# Altium footprint library TarabusLib_KOR.PcbLib: 560 footprints (part 28 of 35)
Each footprint in its own frame and in the unit in brackets; x right, y up, seen from the top. Pads: shape width x height; smd on the part's side, far side on the other; paste and mask are expansions set on the pad; w line width, h text height; cw(c..) or ccw(c..) is an arc to the next point about the centre after c.
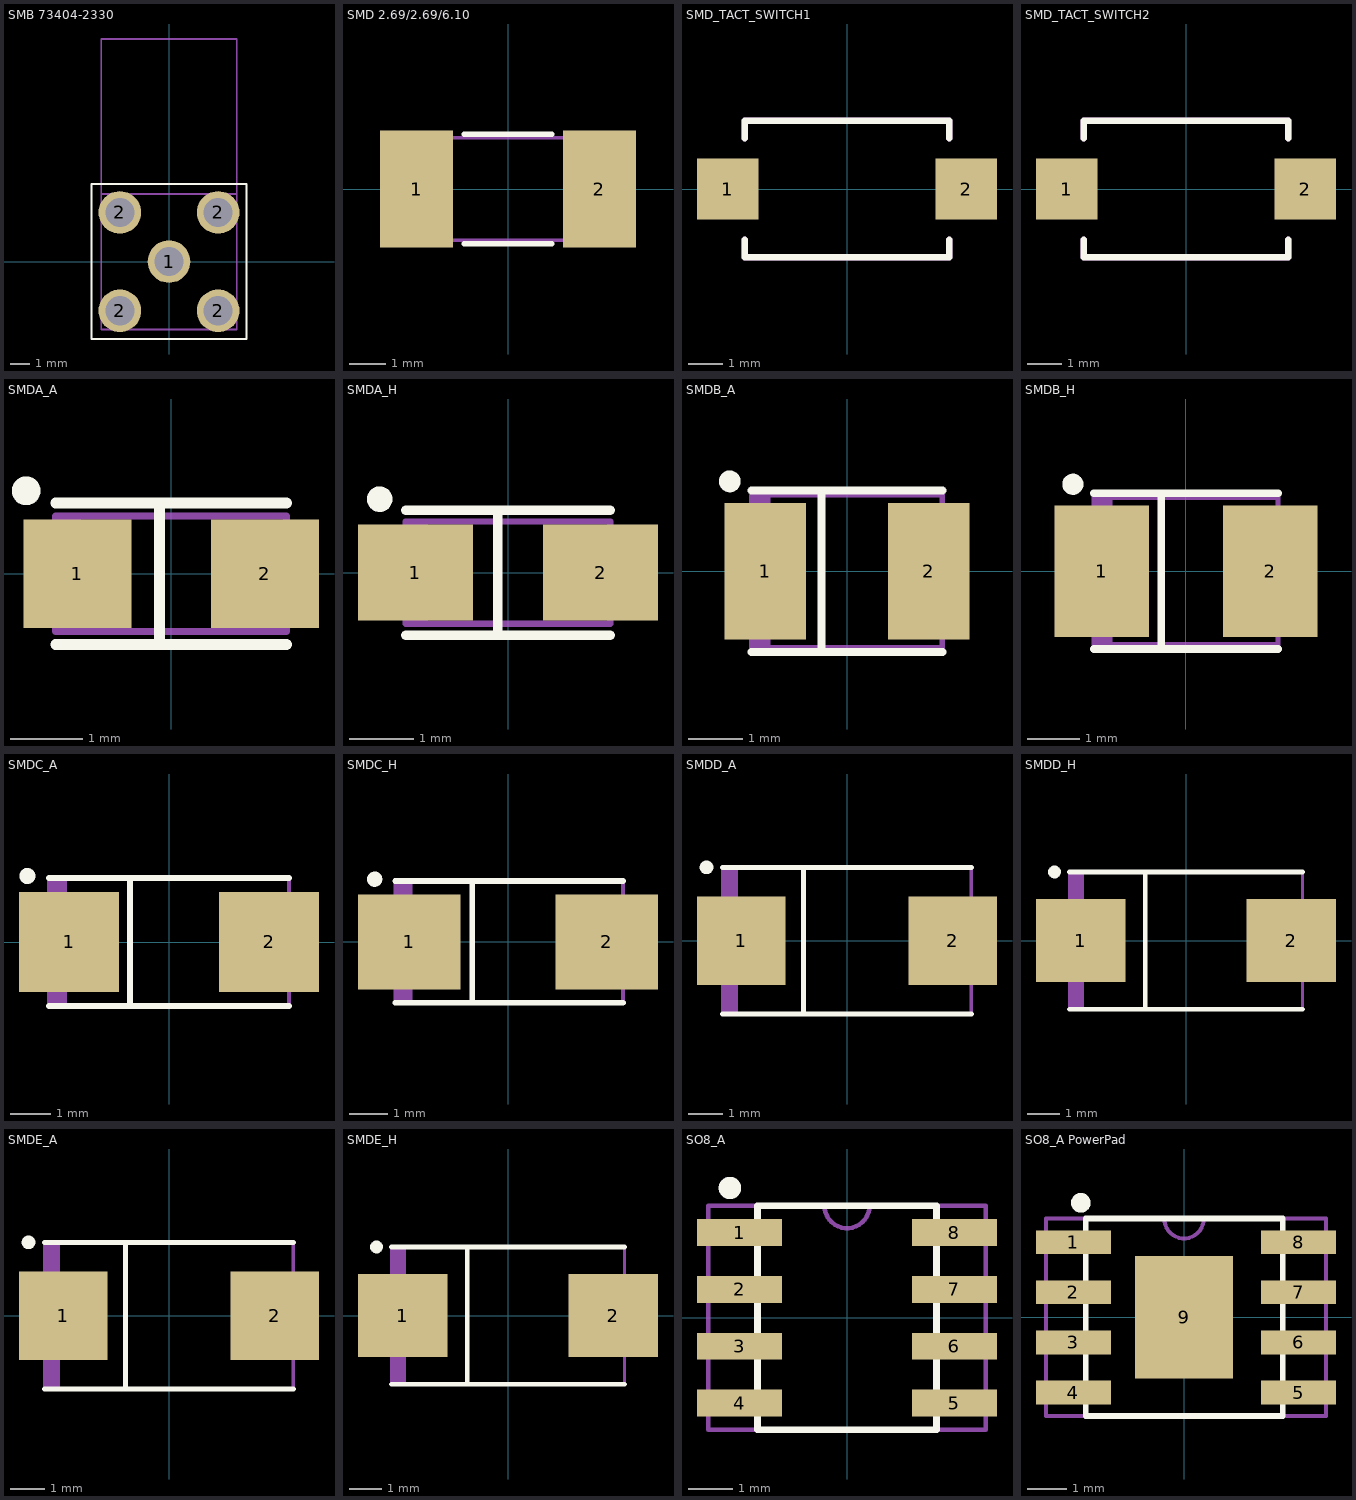
[diagram p27: the footprints below, top view; thin cyan lines are the x and y axes]

## SMB 73404-2330 [mm]
pads (5):
  round 2.2 hole 1.5: 1(0,0) 2(-2.54,-2.54) 2(-2.54,2.54) 2(2.54,-2.54) 2(2.54,2.54)
Top Overlay:
  lines w0.1: -4,-4 4,-4 4,4 -4,4 -4,-4
Mechanical 9:
  text ".Comment" at -0.875,4.45 h0.6
  text ".Designator" at -1.35,5.1 h0.8
Mechanical 11:
  lines w0.1: -3.5,3.5 -3.5,11.5 3.5,11.5 3.5,3.5 ; -3.5,3.5 3.5,3.5 ; -3.5,3.5 -3.5,-3.5 3.5,-3.5 3.5,3.5
3D body "SMB Coaxial.STEP": height 8.15, standoff -4.41, extent -3.125,-3.15 3.175,11

## SMD 2.69/2.69/6.10 [mm]
pads (2):
  rect 2x3.2 smd: 1(-2.5,0) 2(2.5,0)
Top Overlay:
  lines w0.15: -1.2,-1.5 1.2,-1.5 ; -1.2,1.5 1.2,1.5
Mechanical 7:
  lines w0.1: -3.1,-1.4 3.1,-1.4 3.1,1.4 -3.1,1.4 -3.1,-1.4
3D body: height 2.69, standoff 0, extent -3.1,-1.4 3.1,1.4

## SMD_TACT_SWITCH1 [mm]
height 2.5
pads (2):
  rect 1.8x1.8 smd: 1(-3.5,0) 2(3.5,0)
Top Overlay:
  lines w0.2: -3,-1.5 -3,-2 3,-2 3,-1.5 ; -3,1.5 -3,2 3,2 3,1.5
Mechanical 7:
  lines w0.2: -3,-1.5 -3,-2 3,-2 3,-1.5 ; -3,1.5 -3,2 3,2 3,1.5
Mechanical 10:
  text ".Comment" at 0.5,-3 h0.6
  text ".Designator" at -0.5,2.5 h0.8
3D body "Кнопка_IT-1181.STEP": height 2.5, standoff 0, extent -4,-1.8 4,1.8

## SMD_TACT_SWITCH2 [mm]
height 2.5
pads (2):
  rect 1.8x1.8 smd: 1(-3.5,0) 2(3.5,0)
Top Overlay:
  lines w0.2: -3,-1.5 -3,-2 3,-2 3,-1.5 ; -3,1.5 -3,2 3,2 3,1.5
Mechanical 7:
  lines w0.2: -3,-1.5 -3,-2 3,-2 3,-1.5 ; -3,1.5 -3,2 3,2 3,1.5
Mechanical 10:
  text ".Comment" at 0.5,-3 h0.6
  text ".Designator" at -0.5,2.5 h0.6
3D body "Knopka_taktovaya_SMD.step": height 5, standoff 0, extent -4.1,-1.75 4.1,1.75

## SMDA_A [mm]
height 1.6
pads (2):
  rect 1.5x1.5 smd: 1(-1.3,0) 2(1.3,0)
Top Overlay:
  circle w0.2: c-2.01,1.15 r0.1
  lines w0.15: -1.6,-0.98 1.6,-0.98 ; -1.6,0.98 1.6,0.98 ; -0.16,-0.98 -0.16,0.98
Mechanical 9:
  text ".Comment" at -0.88,-1.58 h0.6
  text ".Designator" at -0.84,1.25 h0.8
Mechanical 11:
  lines w0.1: -1.5,-0.8 -1.5,0.8 ; -1.4,-0.8 -1.4,0.8 ; -1.3,-0.8 -1.3,0.8 ; -1.6,-0.8 1.6,-0.8 1.6,0.8 -1.6,0.8 -1.6,-0.8
3D body "SW3dPS-Solid Tantalum Chip Capacitor.STEP": height 1.8, standoff -0.04, extent -2.398,-0.9 2.398,0.903

## SMDA_H [mm]
height 1.6
pads (2):
  rect 1.8x1.5 smd: 1(-1.45,0) 2(1.45,0)
Top Overlay:
  circle w0.2: c-2.01,1.15 r0.1
  lines w0.15: -1.6,-0.98 1.6,-0.98 ; -1.6,0.98 1.6,0.98 ; -0.16,-0.98 -0.16,0.98
Mechanical 7:
  lines w0.1: -1.5,-0.8 -1.5,0.8 ; -1.4,-0.8 -1.4,0.8 ; -1.3,-0.8 -1.3,0.8 ; -1.6,-0.8 1.6,-0.8 1.6,0.8 -1.6,0.8 -1.6,-0.8
Mechanical 10:
  text ".Comment" at -0.92,-1.56 h0.6
  text ".Designator" at -0.84,1.25 h0.8
3D body: height 1.6, standoff 0, extent -1.6,-0.8 1.6,0.8

## SMDB_A [mm]
height 1.9
pads (2):
  rect 1.5x2.5 smd: 1(-1.5,0) 2(1.5,0)
Top Overlay:
  circle w0.2: c-2.15,1.65 r0.1
  lines w0.15: -1.75,-1.48 1.75,-1.48 ; -1.75,1.48 1.75,1.48 ; -0.47,-1.48 -0.47,1.48
Mechanical 9:
  text ".Comment" at -1.02,-2.08 h0.6
  text ".Designator" at -0.9,1.7 h0.8
Mechanical 11:
  lines w0.1: -1.65,-1.4 -1.65,1.4 ; -1.55,-1.4 -1.55,1.4 ; -1.45,-1.4 -1.45,1.4 ; -1.75,-1.4 1.75,-1.4 1.75,1.4 -1.75,1.4 -1.75,-1.4
3D body "User Library-Tantalum Capacitor Case B.STEP": height 2.09, standoff -0.01, extent -1.911,-1.425 1.779,1.395

## SMDB_H [mm]
height 1.9
pads (2):
  rect 1.8x2.5 smd: 1(-1.6,0) 2(1.6,0)
Top Overlay:
  circle w0.2: c-2.15,1.65 r0.1
  lines w0.15: -1.75,-1.48 1.75,-1.48 ; -1.75,1.48 1.75,1.48 ; -0.47,-1.48 -0.47,1.48
Mechanical 7:
  lines w0.1: -1.65,-1.4 -1.65,1.4 ; -1.55,-1.4 -1.55,1.4 ; -1.45,-1.4 -1.45,1.4 ; -1.75,-1.4 1.75,-1.4 1.75,1.4 -1.75,1.4 -1.75,-1.4
Mechanical 10:
  text ".Comment" at -1.08,-2.08 h0.6
  text ".Designator" at -0.9,1.7 h0.8
3D body: height 1.9, standoff 0, extent -1.75,-1.4 1.75,1.4

## SMDC_A [mm]
height 2.5
pads (2):
  rect 2.5x2.5 smd: 1(-2.5,0) 2(2.5,0)
Top Overlay:
  circle w0.2: c-3.54,1.65 r0.1
  lines w0.15: -3,-1.6 3,-1.6 ; -3,1.6 3,1.6 ; -0.97,-1.6 -0.97,1.6
Mechanical 7:
  lines w0.1: -2.9,-1.6 -2.9,1.6 ; -2.8,-1.6 -2.8,1.6 ; -2.7,-1.6 -2.7,1.6 ; -2.6,-1.6 -2.6,1.6 ; -3,-1.6 3,-1.6 3,1.6 -3,1.6 -3,-1.6
Mechanical 10:
  text ".Designator" at -0.6,1.87 h0.8
  text ".Comment" at -0.47,-2.28 h0.6
3D body: height 2.5, standoff 0, extent -3,-1.6 3,1.6

## SMDC_H [mm]
height 2.5
pads (2):
  rect 2.7x2.5 smd: 1(-2.6,0) 2(2.6,0)
Top Overlay:
  circle w0.2: c-3.51,1.65 r0.1
  lines w0.15: -2.97,-1.6 3.03,-1.6 ; -2.97,1.6 3.03,1.6 ; -0.94,-1.6 -0.94,1.6
Mechanical 7:
  lines w0.1: -2.87,-1.6 -2.87,1.6 ; -2.77,-1.6 -2.77,1.6 ; -2.67,-1.6 -2.67,1.6 ; -2.57,-1.6 -2.57,1.6 ; -2.97,-1.6 -2.97,1.6 3.03,1.6 3.03,-1.6 -2.97,-1.6
Mechanical 10:
  text ".Comment" at -0.7,-2.3 h0.6
  text ".Designator" at -0.6,1.89 h0.8
3D body: height 2.5, standoff 0, extent -2.97,-1.6 3.03,1.6

## SMDD_A [mm]
height 2.8
pads (2):
  rect 2.6x2.6 smd: 1(-3.1,0) 2(3.1,0)
Top Overlay:
  circle w0.2: c-4.12,2.15 r0.1
  lines w0.15: -3.65,-2.15 3.65,-2.15 ; -3.65,2.15 3.65,2.15 ; -1.28,-2.15 -1.28,2.15
Mechanical 9:
  text ".Designator" at -0.84,2.54 h0.8
  text ".Comment" at -0.9,-2.91 h0.6
Mechanical 11:
  lines w0.1: -3.55,-2.15 -3.55,2.15 ; -3.45,-2.15 -3.45,2.15 ; -3.35,-2.15 -3.35,2.15 ; -3.25,-2.15 -3.25,2.15 ; -3.65,-2.15 3.65,-2.15 3.65,2.15 -3.65,2.15 -3.65,-2.15
3D body "7343.step": height 2.9, standoff -0.02, extent -3.675,-2.225 3.625,2.075

## SMDD_H [mm]
height 2.8
pads (2):
  rect 2.8x2.6 smd: 1(-3.3,0) 2(3.3,0)
Top Overlay:
  circle w0.2: c-4.12,2.15 r0.1
  lines w0.15: -3.65,-2.15 3.65,-2.15 ; -3.65,2.15 3.65,2.15 ; -1.28,-2.15 -1.28,2.15
Mechanical 7:
  lines w0.1: -3.55,-2.15 -3.55,2.15 ; -3.45,-2.15 -3.45,2.15 ; -3.35,-2.15 -3.35,2.15 ; -3.25,-2.15 -3.25,2.15 ; -3.65,-2.15 -3.65,2.15 3.65,2.15 3.65,-2.15 -3.65,-2.15
Mechanical 10:
  text ".Comment" at -0.83,-2.85 h0.6
  text ".Designator" at -0.84,2.54 h0.8
3D body: height 2.8, standoff 0, extent -3.65,-2.15 3.65,2.15

## SMDE_A [mm]
height 4
pads (2):
  rect 2.6x2.6 smd: 1(-3.1,0) 2(3.1,0)
Top Overlay:
  circle w0.2: c-4.12,2.15 r0.1
  lines w0.15: -3.65,-2.15 3.65,-2.15 ; -3.65,2.15 3.65,2.15 ; -1.28,-2.15 -1.28,2.15
Mechanical 7:
  lines w0.1: -3.55,-2.15 -3.55,2.15 ; -3.45,-2.15 -3.45,2.15 ; -3.35,-2.15 -3.35,2.15 ; -3.25,-2.15 -3.25,2.15 ; -3.65,-2.15 -3.65,2.15 3.65,2.15 3.65,-2.15 -3.65,-2.15
Mechanical 10:
  text ".Comment" at -0.78,-2.82 h0.6
  text ".Designator" at -0.84,2.54 h0.8
3D body: height 4, standoff 0, extent -3.65,-2.15 3.65,2.15

## SMDE_H [mm]
height 4
pads (2):
  rect 2.8x2.6 smd: 1(-3.3,0) 2(3.3,0)
Top Overlay:
  circle w0.2: c-4.12,2.15 r0.1
  lines w0.15: -3.65,-2.15 3.65,-2.15 ; -3.65,2.15 3.65,2.15 ; -1.28,-2.15 -1.28,2.15
Mechanical 7:
  lines w0.1: -3.55,-2.15 -3.55,2.15 ; -3.45,-2.15 -3.45,2.15 ; -3.35,-2.15 -3.35,2.15 ; -3.25,-2.15 -3.25,2.15 ; -3.65,-2.15 3.65,-2.15 3.65,2.15 -3.65,2.15 -3.65,-2.15
Mechanical 10:
  text ".Designator" at -0.84,2.54 h0.8
  text ".Comment" at -0.82,-2.87 h0.6
3D body: height 4, standoff 0, extent -3.65,-2.15 3.65,2.15

## SO8_A [mm]
height 1.75
pads (8):
  rect 1.9x0.6 smd: 1(-2.4,1.905) 2(-2.4,0.635) 3(-2.4,-0.635) 4(-2.4,-1.905) 5(2.4,-1.905) 6(2.4,-0.635) 7(2.4,0.635) 8(2.4,1.905)
Top Overlay:
  circle w0.25: c-2.615,2.9 r0.125
  lines w0.15: -2,-2.5 2,-2.5 2,2.5 -2,2.5 ; -2,-2.475 -2,2.475
Mechanical 9:
  text ".Designator" at -1,3.02 h0.8
  text ".Comment" at -0.69,-3.25 h0.6
Mechanical 11:
  lines w0.1: -2,-2.5 -2,2.5 ; -0.5,2.5 ccw(c0,2.5) 0.5,2.5 ; 2,-2.5 2,2.5 ; -3.1,-2.5 -3.1,2.5 3.1,2.5 3.1,-2.5 -3.1,-2.5
3D body "SOIC-8.STEP": height 1.7, standoff 0, extent -3,-2.54 3,2.54

## SO8_A PowerPad [mm]
pads (9):
  rect 1.9x0.6 smd: 1(-2.8,1.905) 2(-2.8,0.635) 3(-2.8,-0.635) 4(-2.8,-1.905) 5(2.9,-1.905) 6(2.9,-0.635) 7(2.9,0.635) 8(2.9,1.905)
  rect 2.49x3.1 smd: 9(0,0)
Top Overlay:
  circle w0.25: c-2.615,2.9 r0.125
  lines w0.15: -2.49,-2.5 -2.49,2.5 2.5,2.5 2.5,-2.5 -2.49,-2.5
Mechanical 7:
  lines w0.1: -2.5,-2.5 -2.5,2.5 ; -0.5,2.5 ccw(c0,2.5) 0.5,2.5 ; 2.5,-2.5 2.5,2.5 ; -3.5,-2.5 -3.5,2.5 3.6,2.5 3.6,-2.5 -3.5,-2.5
Mechanical 10:
  text ".Designator" at -1,3.02 h0.8
  text ".Comment" at -0.69,-3.25 h0.6
3D body "SOIC-8.STEP": height 1.7, standoff 0, extent -3,-2.54 3,2.54